# Altium footprint library Cty1.PcbLib: 869 footprints (part 39 of 55)
Each footprint in its own frame and in the unit in brackets; x right, y up, seen from the top. Pads: shape width x height; smd on the part's side, far side on the other; paste and mask are expansions set on the pad; w line width, h text height; cw(c..) or ccw(c..) is an arc to the next point about the centre after c.
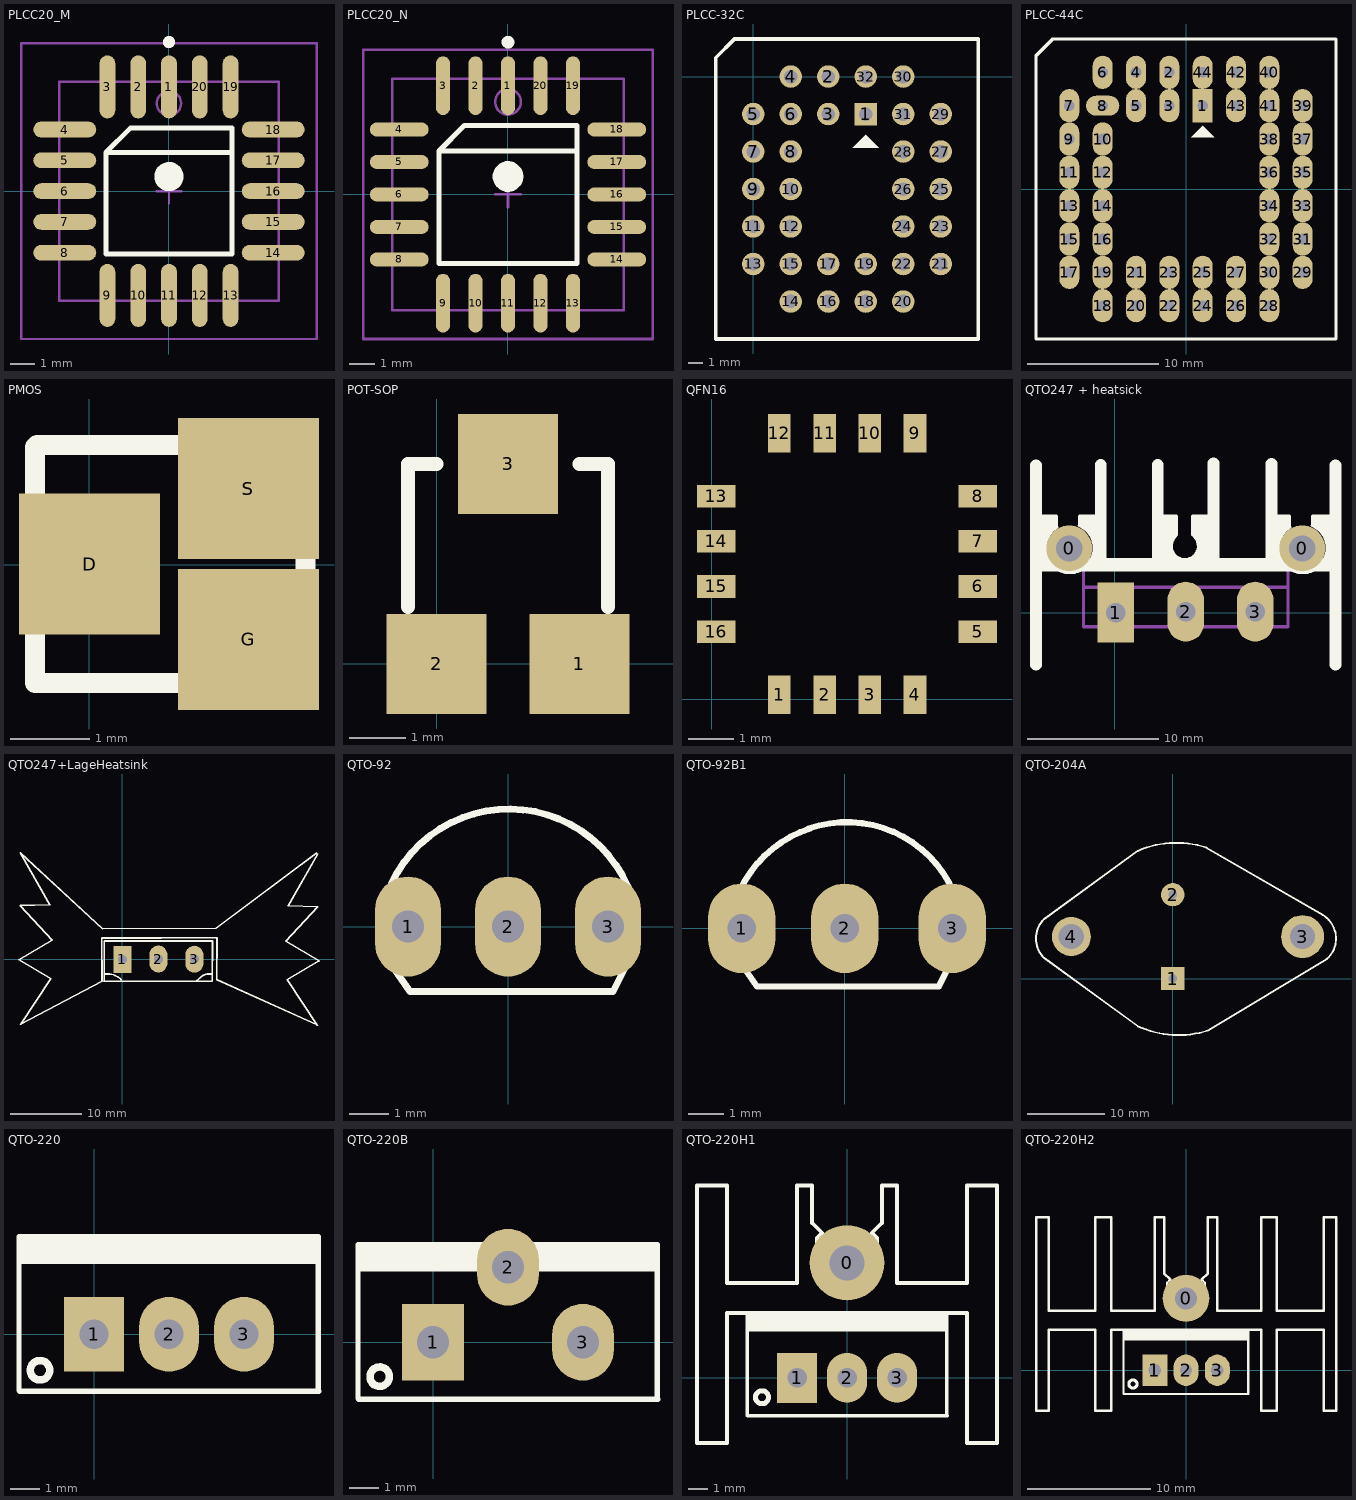
[diagram p38: the footprints below, top view; thin cyan lines are the x and y axes]

## PLCC20_M [mm] "Leaded Chip Carrier, 20-Leads, Body 9x9mm, Pitch 1.27mm, IPC Low Density"
height 4.57
pads (20):
  oval 0.65x2.6 smd: 1(0,4.3) 2(-1.27,4.3) 3(-2.54,4.3) 9(-2.54,-4.3) 10(-1.27,-4.3) 11(0,-4.3) 12(1.27,-4.3) 13(2.54,-4.3) 19(2.54,4.3) 20(1.27,4.3)
  oval 2.6x0.65 smd: 4(-4.3,2.54) 5(-4.3,1.27) 6(-4.3,0) 7(-4.3,-1.27) 8(-4.3,-2.54) 14(4.3,-2.54) 15(4.3,-1.27) 16(4.3,0) 17(4.3,1.27) 18(4.3,2.54)
Top Overlay:
  circle w0.6: c0,0.6 r0.3
  circle w0.25: c0,6.15 r0.125
  lines w0.2: 2.6,1.6 -2.6,1.6 ; -2.6,1.6 -2.6,-2.6 2.6,-2.6 2.6,2.6 -1.6,2.6 -2.6,1.6
Mechanical 13:
  circle w0.1: c0,3.62 r0.5
  lines w0.1: -4.52,-4.52 4.52,-4.52 4.52,4.52 -4.52,4.52 -4.52,-4.52
Mechanical 15:
  lines w0.1: -0.5,0 0.5,0 ; 0,-0.5 0,0.5 ; -6.1,-6.1 6.1,-6.1 6.1,6.1 -6.1,6.1 -6.1,-6.1
3D body: height 4.57, standoff 0, extent -4.52,-4.52 4.52,4.52

## PLCC20_N [mm] "Leaded Chip Carrier, 20-Leads, Body 9x9mm, Pitch 1.27mm, IPC Medium Density"
height 4.57
pads (20):
  oval 0.55x2.3 smd: 1(0,4.25) 2(-1.27,4.25) 3(-2.54,4.25) 9(-2.54,-4.25) 10(-1.27,-4.25) 11(0,-4.25) 12(1.27,-4.25) 13(2.54,-4.25) 19(2.54,4.25) 20(1.27,4.25)
  oval 2.3x0.55 smd: 4(-4.25,2.54) 5(-4.25,1.27) 6(-4.25,0) 7(-4.25,-1.27) 8(-4.25,-2.54) 14(4.25,-2.54) 15(4.25,-1.27) 16(4.25,0) 17(4.25,1.27) 18(4.25,2.54)
Top Overlay:
  circle w0.25: c0,5.95 r0.125
  circle w0.6: c0,0.7 r0.3
  lines w0.2: 2.7,1.7 -2.7,1.7 ; -2.7,1.7 -1.7,2.7 2.7,2.7 2.7,-2.7 -2.7,-2.7 -2.7,1.7
Mechanical 13:
  circle w0.1: c0,3.62 r0.5
  lines w0.1: -4.52,-4.52 -4.52,4.52 4.52,4.52 4.52,-4.52 -4.52,-4.52
Mechanical 15:
  lines w0.1: -0.5,0 0.5,0 ; 0,-0.5 0,0.5 ; -5.65,-5.65 -5.65,5.65 5.65,5.65 5.65,-5.65 -5.65,-5.65
3D body: height 4.57, standoff 0, extent -4.52,-4.52 4.52,4.52

## PLCC-32C [mil] "Socket PLCC32R"
height 200
pads (32):
  rect 60x60 hole 36: 1(300,-100)
  round 60 hole 36: 2(200,0) 3(200,-100) 4(100,0) 5(0,-100) 6(100,-100) 7(0,-200) 8(100,-200) 9(0,-300) 10(100,-300) 11(0,-400) 12(100,-400) 13(0,-500) 14(100,-600) 15(100,-500) 16(200,-600) 17(200,-500) 18(300,-600) 19(300,-500) 20(400,-600) 21(500,-500) 22(400,-500) 23(500,-400) 24(400,-400) 25(500,-300) 26(400,-300) 27(500,-200) 28(400,-200) 29(500,-100) 30(400,0) 31(400,-100) 32(300,0)
Top Overlay:
  region: 300,-155 265,-190 335,-190
  lines w10: -100,-700 600,-700 600,100 -50,100 -100,50 -100,-700

## PLCC-44C [mil] "QPC-44C"
height 200
pads (44):
  rect 60x100 hole 32: 1(50,250)
  oval 60x100 hole 32: 2(-50,350) 3(-50,250) 4(-150,350) 5(-150,250) 6(-250,350) 7(-350,250) 9(-350,150) 10(-250,150) 11(-350,50) 12(-250,50) 13(-350,-50) 14(-250,-50) 15(-350,-150) 16(-250,-150) 17(-350,-250) 18(-250,-350) 19(-250,-250) 20(-150,-350) 21(-150,-250) 22(-50,-350) 23(-50,-250) 24(50,-350) 25(50,-250) 26(150,-350) 27(150,-250) 28(250,-350) 29(350,-250) 30(250,-250) 31(350,-150) 32(250,-150) 33(350,-50) 34(250,-50) 35(350,50) 36(250,50) 37(350,150) 38(250,150) 39(350,250) 40(250,350) 41(250,250) 42(150,350) 43(150,250) 44(50,350)
  oval 100x60 hole 32: 8(-250,250)
Top Overlay:
  region: 50,190 15,155 85,155
  lines w10: -450,-450 450,-450 450,450 -400,450 -450,400 -450,-450

## PMOS [mil]
pads (3):
  rect 70x70 smd: D(0.25,0.25) G(78.99,-37.15) S(78.99,37.65)
Top Overlay:
  lines w10: -26.75,-58.75 107.25,-58.75 107.25,59.25 -25.75,59.25 -26.75,58.25 -26.75,-58.75

## POT-SOP [mil]
pads (3):
  rect 70x70 smd: 1(100,0) 2(0,0) 3(50,140)
Top Overlay:
  lines w10: -20,40 -20,140 0,140 ; 100,140 120,140 120,40

## QFN16 [mm] "QFN 16 LEAD 6x6mm"
height 2
pads (16):
  rect 0.5x0.85 smd: 1(1.5,0.104) 2(2.5,0.104) 3(3.5,0.104) 4(4.5,0.104) 9(4.5,5.89) 10(3.5,5.89) 11(2.5,5.89) 12(1.5,5.89)
  rect 0.85x0.5 smd: 5(5.89,1.5) 6(5.89,2.5) 7(5.89,3.5) 8(5.89,4.5) 13(0.1,4.5) 14(0.1,3.5) 15(0.1,2.5) 16(0.1,1.5)
3D body: height 0.8, standoff 0, extent 0,0 6,6

## QTO247 + heatsick [mil]
pads (5):
  round 137.8 hole 78.74: 0(-136.34,194) 0(563.66,194)
  rect 110x180 hole 59.06: 1(3,1)
  oval 110x180 hole 59.06: 2(213.66,4) 3(422.32,4)
Top Overlay:
  region: 230,290 290,290 290,150 280,160 230,160 250,180 250,220 230,240
  region: 140,290 190,290 190,240 170,220 170,180 190,160 140,160
  region: -105,290 -105,265 -85,245 -80,245 -70,235 -70,225 -65,220 -65,160 -40,160 -35,165 -50,180 -50,290
  region: -225,290 -175,290 -175,255 -180,255 -200,235 -200,225 -210,215 -210,180 -205,175 -205,160 -225,160
  region: 475,290 525,290 525,255 520,255 500,235 500,225 490,215 490,180 495,175 495,160 475,160
  region: 595,290 595,265 615,245 620,245 630,235 630,225 635,220 635,160 660,160 665,165 650,180 650,290
  lines w10: -225,290 -175,290 -175,260 ; -173.69,257.87 ccw(c-135,195) -105.92,262.86 ; -163.31,220 ccw(c-134.15,190.85) -105,220 ; -105,265 -105,290 -55,290 ; 130,290 185,290 185,235 180,230 ; 181.96,229.73 ccw(c210.85,200.85) 239.73,229.73 ; 240,230 235,235 235,290 280,290 ; 475,290 525,290 525,260 ; 526.31,257.87 ccw(c565,195) 594.08,262.86 ; 595,265 595,290 645,290
  lines w35: -236.34,-156 -236.34,444 ; -42,149 -42,445 ; 129,149 129,445 ; 297,148 297,450 ; 471,148 471,448 ; 663.66,-156 663.66,444
  lines w40: -230,145 655,145
Mechanical 1:
  lines w10: -93.43,76.83 520.75,76.83 ; -93.43,-41.28 520.75,-41.28 520.75,135.89 -93.43,135.89 -93.43,-41.28
3D body: height 940.6, standoff -479.4, extent -92,-73 508,107
3D body: height 1206.11, standoff 0.6, extent -252.79,-166.67 648.79,479

## QTO247+LageHeatsink [mil]
pads (3):
  rect 100x150 hole 50: 1(0,-1)
  oval 100x150 hole 50: 2(200,1) 3(400,0)
Top Overlay:
  lines w10: -102,-121 -101,-120 -101,102 501,102 500,-122 -101,-122 -100,-121 ; -100,-82 -80.43,-82 cw(c-80.43,-184.43) -8,-112 ; 208,119 526,119 524,-113 1082,-364 ; 214,118 -115,118 -113,-122 -566,-361 -398,-108 -575,-3 -391,106 -568,298 -403,303 -568,592 -111,170 520,172 1078,590 ; 415,-119 ccw(c415,-116.59) 416.71,-118.29 434,-101 cw(c479.87,-146.87) 479.87,-82 499,-82 ; 1084,-367 916,-114 1093,-9 909,100 1086,292 921,297 1086,586
3D body: height 1006.77, standoff -610.16, extent -108.98,-107 518.98,91.03
3D body: height 1100, standoff 100, extent -619,-329 1031,633

## QTO-92 [mil] "TO-92"
height 200
pads (3):
  oval 66x100 hole 32: 1(-100,0) 2(0,0) 3(100,0)
Top Overlay:
  lines w7: -116.52,43.21 cw(c0.97,-12.43) 119.94,39.97 ; -115.34,-40.24 -98,-65 105,-65 118,-39
3D body: height 245.04, standoff -199.79, extent -108.87,-65.56 108.86,95

## QTO-92B1 [mil] "TO-92"
height 200
pads (3):
  oval 75x100 hole 32: 1(-115,0) 2(0,0) 3(120,0)
Top Overlay:
  lines w7: -116.52,43.21 cw(c0.97,-12.43) -38.82,111.34 ; -115.34,-40.24 -98,-65 105,-65 118,-39 ; -40.42,111.21 cw(c2.42,-11.53) 121.49,40.65
3D body: height 245.04, standoff -199.79, extent -112.74,-65.56 105,95

## QTO-204A [mil] "Pin For 2N3055, 2N2955"
pads (4):
  rect 120x120 hole 45: 1(0,0)
  round 120 hole 45: 2(0,430)
  round 220 hole 130: 3(665,215)
  round 200 hole 130: 4(-520,215)
Top Overlay:
  lines w10: -660,105 cw(c-560,205) -660,305 -179.46,654.16 ; -659.88,104.89 -178.69,-244.72 ; -179.53,654.34 cw(c18.37,195.17) 171.59,671.11 ; -178.9,-245.19 ccw(c28.37,209.83) 180.47,-266.47 ; 171.46,670.71 769.34,325.52 ; 180.28,-266.15 789.88,100.13 ccw(c695,205) 769.25,325.36

## QTO-220 [mil] "TO-220 - 1-2-3"
height 200
pads (3):
  rect 80x100 hole 39: 1(0,0)
  oval 80x100 hole 39: 2(100,0) 3(200,0)
Top Overlay:
  circle w10: c-72.03,-48 r12.97
  rectangle: -99,94 300,130
  lines w7: 298,107 299,93 ; -100,-75 -99,-76 -76,-76 300,-76 299,-75 299,130 -100,130 -100,-75
3D body: height 754.72, standoff -400, extent -119,-64 322.46,120.65

## QTO-220B [mm] "TO-220 - 1-2-3"
height 5.08
pads (3):
  rect 2.1x2.6 hole 1.1: 1(0,0)
  oval 2.1x2.6 hole 1.1: 2(2.54,2.54) 3(5.08,0)
Top Overlay:
  circle w0.254: c-1.804,-1.168 r0.329
  rectangle: -2.515,2.388 7.62,3.302
  lines w0.178: 7.569,2.718 7.595,2.362 ; -2.54,-1.905 -2.54,3.302 7.595,3.302 7.595,-1.905 7.62,-1.93 -1.93,-1.93 -2.515,-1.93 -2.54,-1.905
3D body: height 20.58, standoff -8.2, extent -2.356,-2.062 7.544,2.438

## QTO-220H1 [mil] "TO-220 - 1-2-3"
height 200
pads (4):
  round 150 hole 70: 0(0,230)
  rect 80x100 hole 39: 1(-100,0)
  oval 80x100 hole 39: 2(0,0) 3(100,0)
Top Overlay:
  circle w10: c-170.03,-39 r12.97
  rectangle: -201,93 198,129
  lines w7: -200,100 198.5,100 199,93 ; -200,-75 -199,-76 -176,-76 200,-76 199,-75 199,130 -200,130 -200,-75
  lines w8: -300,-130 -300,385 -240,385 -240,190 -100,190 -100,385 -70,385 -70,310 -50,290 -60,280 -60,210 -40,190 40,190 60,210 60,280 50,290 70,310 70,385 100,385 100,190 240,190 240,385 300,385 300,-130 240,-130 240,130 -240,130 -240,-130 -300,-130
3D body: height 1000, standoff -122.05, extent -246,73.03 250.06,328.97
3D body: height 850.24, standoff -282.83, extent -194.88,-82 194.88,95.17

## QTO-220H2 [mil] "TO-220 - 1-2-3"
height 200
pads (4):
  round 150 hole 70: 0(0,230)
  rect 80x100 hole 39: 1(-100,0)
  oval 80x100 hole 39: 2(0,0) 3(100,0)
Top Overlay:
  circle w10: c-169.97,-44 r12.97
  rectangle: -201,95 198,131
  lines w7: -200,100 198.5,100 199,93 ; -200,-75 -199,-76 -176,-76 200,-76 199,-75 199,130 -200,130 -200,-75
  lines w8: -480,-130 -480,490 -440,490 -440,190 -290,190 -290,490 -240,490 -240,190 -100,190 -100,490 -70,490 -70,310 -50,290 -60,280 -60,210 -40,190 40,190 60,210 60,280 50,290 70,310 70,490 100,490 100,190 240,190 240,490 290,490 290,190 440,190 440,490 480,490 480,-130 440,-130 440,130 290,130 290,-130 240,-130 240,130 -240,130 -240,-130 -290,-130 -290,130 -440,130 -440,-130 -480,-130
3D body: height 810.24, standoff -322.83, extent -194.76,-82.17 195,95
3D body: height 1205.51, standoff 0, extent -448.79,-177 452.79,468.67